# Altium footprint library SINA.PcbLib: 103 footprints (part 2 of 7)
Each footprint in its own frame and in the unit in brackets; x right, y up, seen from the top. Pads: shape width x height; smd on the part's side, far side on the other; paste and mask are expansions set on the pad; w line width, h text height; cw(c..) or ccw(c..) is an arc to the next point about the centre after c.
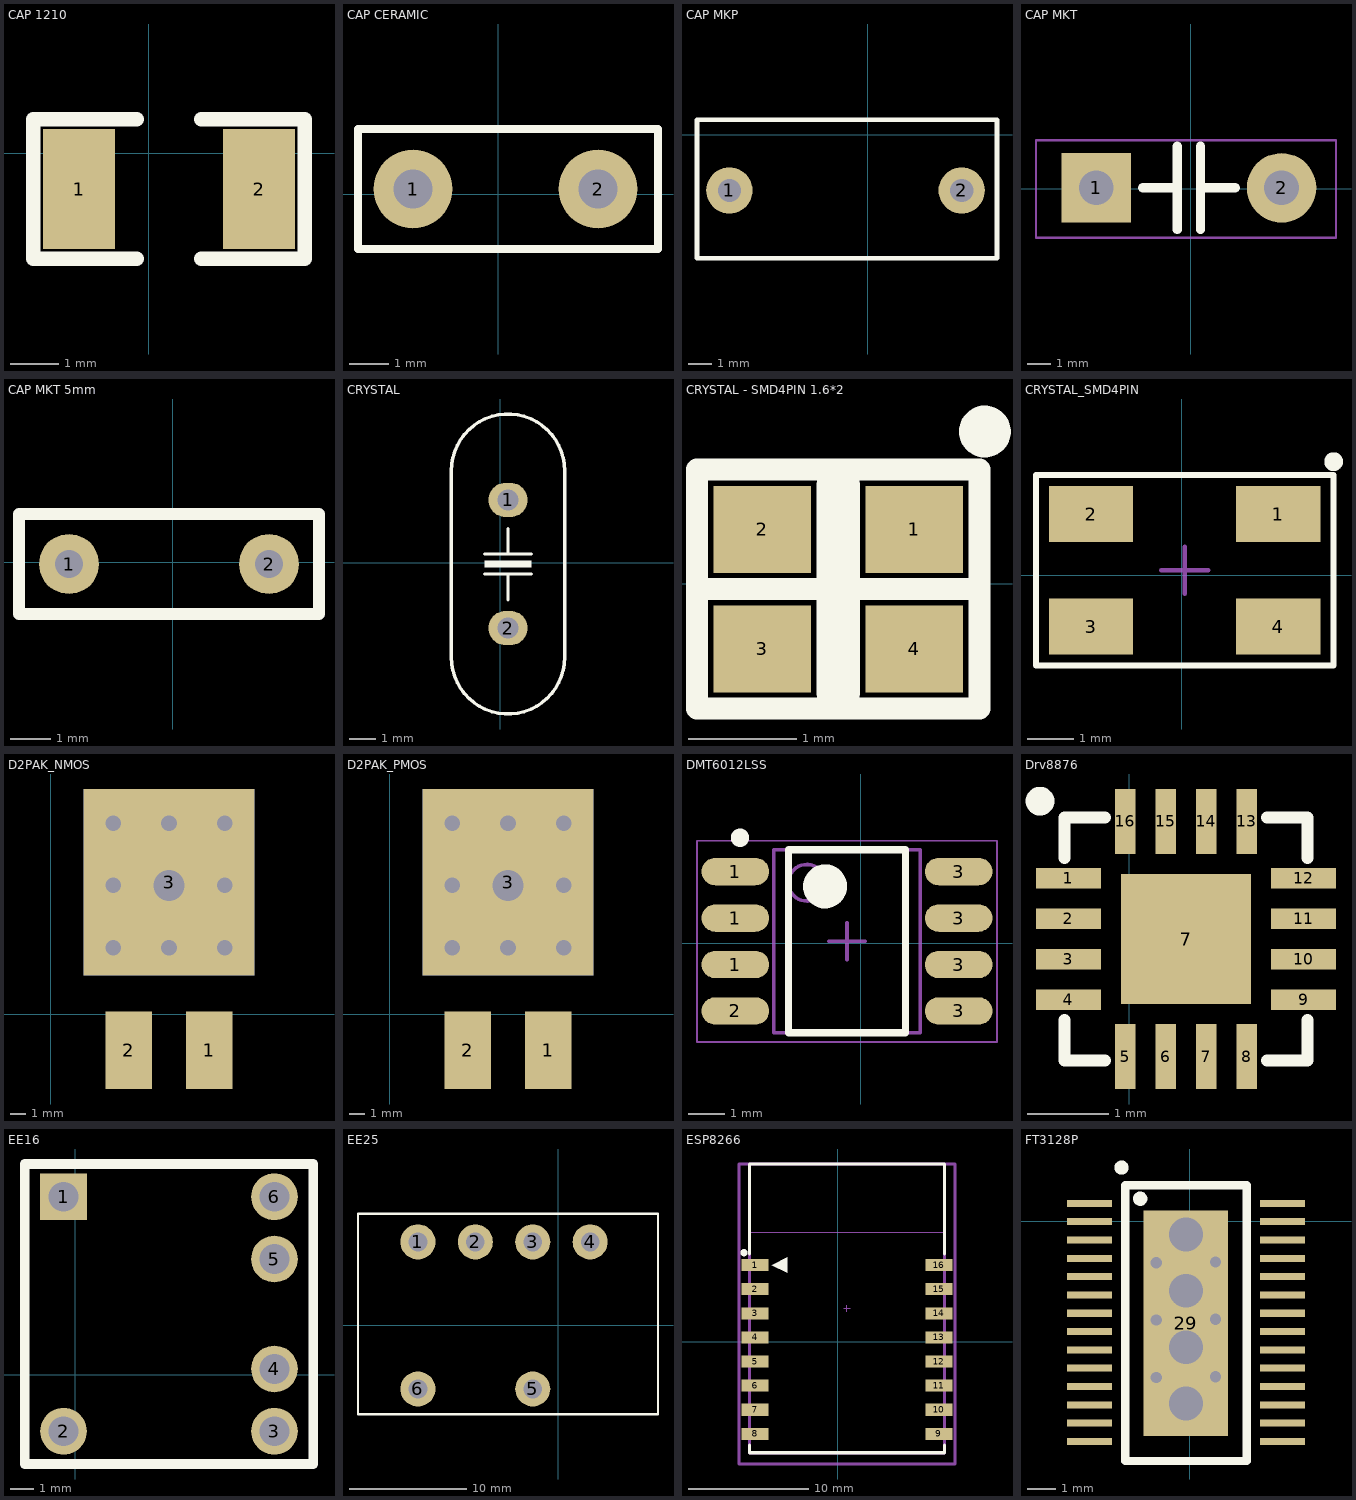
[diagram p1: the footprints below, top view; thin cyan lines are the x and y axes]

## CAP 1210 [mm]
pads (2):
  rect 1.5x2.5 smd: 1(-1.45,-0.75) 2(2.3,-0.75)
Top Overlay:
  lines w0.3: -0.25,-2.2 -2.4,-2.2 -2.4,0.7 -0.25,0.7 ; 1.1,-2.2 3.25,-2.2 3.25,0.7 1.1,0.7

## CAP CERAMIC [mm]
pads (2):
  round 2 hole 1: 1(-2.159,0.127) 2(2.54,0.127)
Top Overlay:
  lines w0.2: -3.556,-1.397 -3.556,1.651 4.064,1.651 4.064,-1.397 -3.556,-1.397
3D body "User Library-VDR-1.STEP": height 9.9, standoff -5.32, extent -3.646,-1.524 4.154,1.676

## CAP MKP [mm]
pads (2):
  round 2 hole 1: 1(-5.969,-2.413) 2(4.064,-2.413)
Top Overlay:
  lines w0.2: -7.366,-5.334 5.588,-5.334 5.588,0.635 -7.366,0.635 -7.366,-5.334
3D body "70395748.stp": height 12.75, standoff -4.25, extent -7.389,-5.334 5.611,0.667

## CAP MKT [mm]
pads (2):
  rect 3x3 hole 1.5: 1(-4.074,0.047)
  round 3 hole 1.5: 2(3.926,0.047)
Top Overlay:
  lines w0.406: -2.074,0.047 -0.574,0.047 ; -0.574,-1.753 -0.574,1.847 ; 0.426,-1.753 0.426,1.847 ; 0.426,0.047 1.926,0.047
Mechanical 13:
  lines w0.1: -6.674,-2.103 6.276,-2.103 6.276,2.097 -6.674,2.097 -6.674,-2.103
3D body "WIMAMKP4W4L13H9C10.SLDPRT": height 9, standoff -4, extent -6.699,-2.103 6.301,2.097

## CAP MKT 5mm [mm]
pads (2):
  round 1.5 hole 0.7: 1(-2.6,-0.05) 2(2.4,-0.05)
Top Overlay:
  lines w0.3: -3.85,-1.3 3.65,-1.3 3.65,1.2 -3.85,1.2 -3.85,-1.3
3D body: height 6.5, standoff 0, extent -3.85,-1.3 3.65,1.2

## CRYSTAL [mm]
pads (2):
  oval 1.5x1.3 hole 0.8: 1(0.301,2.401) 2(0.301,-2.479)
Top Overlay:
  region: -0.588,0.088 -0.588,-0.166 1.19,-0.166 1.19,0.088
  lines w0.127: -0.588,-0.42 1.19,-0.42 ; -0.588,0.342 1.19,0.342 ; 0.301,-1.411 0.301,-0.42 ; 0.301,0.342 0.301,1.307 ; -1.858,-3.595 ccw(c0.301,-3.595) 2.46,-3.595 2.46,3.517 ccw(c0.301,3.517) -1.858,3.517 -1.858,-3.595
3D body "Crystal-3.8mm.STEP": height 3.56, standoff -2, extent -1.949,-5.789 2.551,5.711

## CRYSTAL - SMD4PIN 1.6*2 [mm]
pads (4):
  rect 0.9x0.8 smd: 1(2.3,0.5) 2(0.9,0.5) 3(0.9,-0.6) 4(2.3,-0.6)
Top Overlay:
  circle w0.254: c2.95,1.4 r0.112
  lines w0.2: 0.3,-0.05 2.9,-0.05 ; 0.3,1 0.3,1.05 ; 0.3,1.05 2.9,1.05 2.9,-1.15 2.45,-1.15 0.3,-1.15 0.3,1.05
  lines w0.4: 1.6,-1 1.6,0.9
3D body: height 0.5, standoff 0, extent 0.6,-0.85 2.6,0.75

## CRYSTAL_SMD4PIN [mm]
pads (4):
  rect 1.8x1.2 smd: 1(2.061,1.308) 2(-1.939,1.308) 3(-1.939,-1.092) 4(2.061,-1.092)
Top Overlay:
  circle w0.3: c3.241,2.428 r0.05
  lines w0.127: -3.114,-1.924 -3.114,2.14 3.236,2.14 3.236,-1.924 -3.114,-1.924
Mechanical 15:
  lines w0.05: -3.114,-1.924 3.236,-1.924 3.236,2.14 -3.114,2.14 -3.114,-1.924
  lines w0.1: -0.439,0.108 0.561,0.108 ; 0.061,-0.392 0.061,0.608
3D body: height 0.9, standoff 0, extent -2.479,-1.416 2.601,1.632

## D2PAK_NMOS [mm]
pads (3):
  rect 3x5 smd: 1(10.2,-2.3) 2(5,-2.3)
  rect 11x12 smd: 3(7.6,8.5)
via 11.2,12.3 diameter 3 hole 1
via 7.6,12.3 diameter 3 hole 1
via 4,12.3 diameter 3 hole 1
via 4,4.3 diameter 3 hole 1
via 7.6,4.3 diameter 3 hole 1
via 11.2,4.3 diameter 3 hole 1
via 11.2,8.3 diameter 3 hole 1
via 7.6,8.3 diameter 3 hole 2
via 4,8.3 diameter 3 hole 1
Bottom Layer:
  rectangle: 2.1,2.5 13.1,14.5
3D body "User Library-irf9z34ns mosfet.STEP": height 4.69, standoff 0, extent 2.52,-2.08 12.68,13.36

## D2PAK_PMOS [mm]
pads (3):
  rect 3x5 smd: 1(10.2,-2.3) 2(5,-2.3)
  rect 11x12 smd: 3(7.6,8.5)
via 4,8.3 diameter 3 hole 1
via 7.6,8.3 diameter 3 hole 2
via 11.2,8.3 diameter 3 hole 1
via 11.2,4.3 diameter 3 hole 1
via 7.6,4.3 diameter 3 hole 1
via 4,4.3 diameter 3 hole 1
via 4,12.3 diameter 3 hole 1
via 7.6,12.3 diameter 3 hole 1
via 11.2,12.3 diameter 3 hole 1
Bottom Layer:
  rectangle: 2.1,2.5 13.1,14.5
3D body "User Library-irf9z34ns mosfet.STEP": height 4.69, standoff 0, extent 2.52,-2.08 12.68,13.36

## DMT6012LSS [mm]
pads (8):
  oval 1.85x0.75 smd: 1(-3.423,-0.582) 1(-3.423,0.688) 1(-3.423,1.958) 2(-3.423,-1.852) 3(2.681,-1.852) 3(2.681,-0.582) 3(2.681,0.688) 3(2.681,1.958)
Top Overlay:
  circle w0.6: c-0.971,1.553 r0.3
  circle w0.25: c-3.296,2.883 r0.125
  lines w0.2: -1.971,-2.447 1.229,-2.447 1.229,2.553 -1.971,2.553 -1.971,-2.447
Mechanical 13:
  circle w0.1: c-1.471,1.653 r0.5
  lines w0.1: -2.371,-2.447 1.629,-2.447 1.629,2.553 -2.371,2.553 -2.371,-2.447
Mechanical 15:
  lines w0.05: -4.471,-2.697 3.729,-2.697 3.729,2.803 -4.471,2.803 -4.471,-2.697
  lines w0.1: -0.871,0.053 0.129,0.053 ; -0.371,-0.447 -0.371,0.553
3D body "LM358.step": height 1.35, standoff 0, extent -3.621,-2.447 2.879,2.553

## Drv8876 [mm]
pads (17):
  rect 0.8x0.25 smd: 1(-0.75,3.1) 2(-0.75,2.6) 3(-0.75,2.1) 4(-0.75,1.6) 9(2.15,1.6) 10(2.15,2.1) 11(2.15,2.6) 12(2.15,3.1)
  rect 0.25x0.8 smd: 5(-0.05,0.9) 6(0.45,0.9) 7(0.95,0.9) 8(1.45,0.9) 13(1.45,3.8) 14(0.95,3.8) 15(0.45,3.8) 16(-0.05,3.8)
  rect 1.6x1.6 smd: 7(0.7,2.35)
Top Overlay:
  circle w0.254: c-1.1,4.05 r0.05
  lines w0.15: -0.8,1.35 -0.8,0.85 -0.3,0.85 ; -0.8,3.35 -0.8,3.85 -0.3,3.85 ; 1.7,0.85 2.2,0.85 2.2,1.35 ; 1.7,3.85 2.2,3.85 2.2,3.35
3D body: height 0.8, standoff 0, extent -0.8,0.85 2.2,3.85

## EE16 [mm]
pads (6):
  rect 2x2 hole 1.27: 1(-0.508,7.62)
  round 2 hole 1.27: 2(-0.508,-2.413) 3(8.509,-2.413) 4(8.509,0.254) 5(8.509,4.953) 6(8.509,7.62)
Top Overlay:
  lines w0.406: -2.159,-3.81 10.16,-3.81 ; -2.159,-3.683 -2.159,9.017 10.16,9.017 10.16,-3.683
3D body "EE13-T304.SLDPRT": height 14.19, standoff 1.27, extent -2.495,-4.01 10.531,9.21

## EE25 [mm]
pads (6):
  round 3 hole 1.6: 1(-12.023,7.112) 2(-7.112,7.112) 3(-2.201,7.112) 4(2.709,7.112) 5(-2.201,-5.461) 6(-12.023,-5.461)
Top Overlay:
  lines w0.2: -17.145,-7.62 8.509,-7.62 8.509,9.525 -17.145,9.525 -17.145,-7.62
3D body "User Library-EE25_13_7_ferrite_transformer.STEP": height 26.5, standoff -3.4, extent -17.818,-7.861 9.182,9.639

## ESP8266 [mm]
pads (16):
  rect 2.25x1 smd: 1(-6.862,6.358) 2(-6.862,4.358) 3(-6.862,2.358) 4(-6.862,0.358) 5(-6.862,-1.642) 6(-6.862,-3.642) 7(-6.862,-5.642) 8(-6.862,-7.642) 9(8.388,-7.642) 10(8.388,-5.642) 11(8.388,-3.642) 12(8.388,-1.642) 13(8.388,0.358) 14(8.388,2.358) 15(8.388,4.358) 16(8.388,6.358)
Top Overlay:
  circle w0.3: c-7.787,7.383 r0.15
  region: -5.467,6.358 -4.197,5.723 -4.197,6.993
  lines w0.254: -7.321,-8.558 -7.321,-9.21 8.847,-9.21 8.847,-8.558 ; -7.321,7.274 -7.321,14.729 8.847,14.729 8.847,7.274
Mechanical 13:
  lines w0.051: -7.364,9.085 -7.364,14.74 8.892,14.74 8.892,9.085 -7.364,9.085
  lines w0.254: -7.321,-9.21 8.847,-9.21 8.847,14.729 -7.321,14.729 -7.321,-9.21
Mechanical 15:
  lines w0.1: 0.509,2.76 1.017,2.76 ; 0.763,2.506 0.763,3.014
  lines w0.254: -8.212,-10.142 -8.212,14.729 9.738,14.729 9.738,-10.142 -8.212,-10.142
3D body "ESP_12_E.STEP": height 2.75, standoff 0.04, extent -7.236,-9.133 8.764,14.867

## FT3128P [mm]
pads (29):
  rect 1.6x0.25 smd: 1(-3.55,0.635) 2(-3.55,-0.015) 3(-3.55,-0.665) 4(-3.55,-1.315) 5(-3.55,-1.965) 6(-3.55,-2.615) 7(-3.55,-3.265) 8(-3.55,-3.915) 9(-3.55,-4.565) 10(-3.55,-5.215) 11(-3.55,-5.865) 12(-3.55,-6.515) 13(-3.55,-7.165) 14(-3.55,-7.815) 15(3.3,-7.815) 16(3.3,-7.165) 17(3.3,-6.515) 18(3.3,-5.865) 19(3.3,-5.215) 20(3.3,-4.565) 21(3.3,-3.915) 22(3.3,-3.265) 23(3.3,-2.615) 24(3.3,-1.965) 25(3.3,-1.315) 26(3.3,-0.665) 27(3.3,-0.015) 28(3.3,0.635)
  rect 3x8 all layers, no hole: 29(-0.127,-3.62)
via 0.923,-1.445 diameter 0.9 hole 0.4
via 0.923,-3.482 diameter 0.9 hole 0.4
via 0.923,-5.52 diameter 0.9 hole 0.4
via -1.177,-5.544 diameter 0.9 hole 0.4
via -1.177,-3.507 diameter 0.9 hole 0.4
via -1.177,-1.47 diameter 0.9 hole 0.4
via -0.127,-6.47 diameter 1.2 hole 1.2
via -0.127,-4.47 diameter 1.2 hole 1.2
via -0.127,-2.47 diameter 1.2 hole 1.2
via -0.127,-0.47 diameter 1.2 hole 1.2
Top Overlay:
  circle w0.254: c-1.75,0.8 r0.127
  circle w0.254: c-2.413,1.905 r0.127
  lines w0.3: -2.286,-8.509 -2.286,1.27 2.032,1.27 2.032,-8.509 -2.286,-8.509
3D body: height 0.5, standoff 0, extent 2,0.5 3.064,0.75
3D body: height 0.5, standoff 0, extent 2,-0.15 3.064,0.1
3D body: height 0.5, standoff 0, extent 2,-0.8 3.064,-0.55
3D body: height 0.5, standoff 0, extent 2,-1.45 3.064,-1.2
3D body: height 0.5, standoff 0, extent 2,-2.1 3.064,-1.85
3D body: height 0.5, standoff 0, extent 2,-2.75 3.064,-2.5
3D body: height 0.5, standoff 0, extent 2,-3.4 3.064,-3.15
3D body: height 0.5, standoff 0, extent 2,-4.05 3.064,-3.8
3D body: height 0.5, standoff 0, extent 2,-4.7 3.064,-4.45
3D body: height 0.5, standoff 0, extent 2,-5.35 3.064,-5.1
3D body: height 0.5, standoff 0, extent 2,-6 3.064,-5.75
3D body: height 0.5, standoff 0, extent 2,-6.65 3.064,-6.4
3D body: height 0.5, standoff 0, extent 2,-7.3 3.064,-7.05
3D body: height 0.5, standoff 0, extent 2,-7.95 3.064,-7.7
3D body: height 0.5, standoff 0, extent -3.35,-7.95 -2.286,-7.7
3D body: height 0.5, standoff 0, extent -3.35,-7.3 -2.286,-7.05
3D body: height 0.5, standoff 0, extent -3.35,-6.65 -2.286,-6.4
3D body: height 0.5, standoff 0, extent -3.35,-6 -2.286,-5.75
3D body: height 0.5, standoff 0, extent -3.35,-5.35 -2.286,-5.1
3D body: height 0.5, standoff 0, extent -3.35,-4.7 -2.286,-4.45
3D body: height 0.5, standoff 0, extent -3.35,-4.05 -2.286,-3.8
3D body: height 0.5, standoff 0, extent -3.35,-3.4 -2.286,-3.15
3D body: height 0.5, standoff 0, extent -3.35,-2.75 -2.286,-2.5
3D body: height 0.5, standoff 0, extent -3.35,-2.1 -2.286,-1.85
3D body: height 0.5, standoff 0, extent -3.35,-1.45 -2.286,-1.2
3D body: height 0.5, standoff 0, extent -3.35,-0.8 -2.286,-0.55
3D body: height 0.5, standoff 0, extent -3.35,-0.15 -2.286,0.1
3D body: height 0.5, standoff 0, extent -3.35,0.5 -2.286,0.75
3D body: height 1, standoff 0, extent -2.286,-8.509 2.032,1.27